# Altium footprint library pmu.PcbLib: 86 footprints (part 6 of 6)
Each footprint in its own frame and in the unit in brackets; x right, y up, seen from the top. Pads: shape width x height; smd on the part's side, far side on the other; paste and mask are expansions set on the pad; w line width, h text height; cw(c..) or ccw(c..) is an arc to the next point about the centre after c.
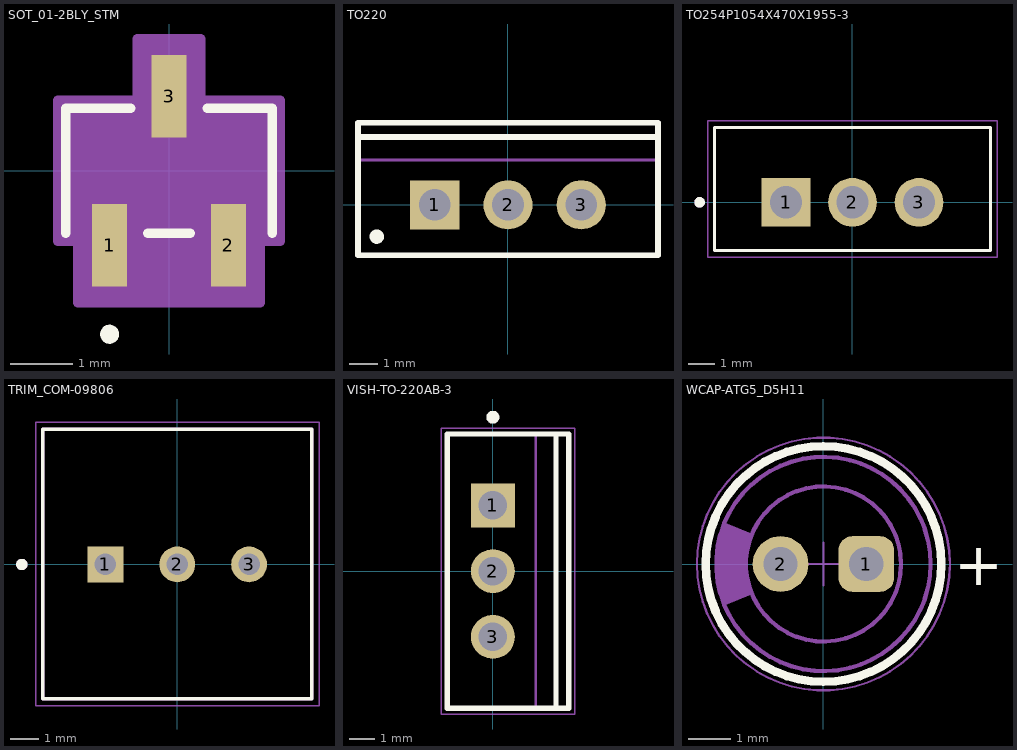
[diagram p5: the footprints below, top view; thin cyan lines are the x and y axes]

## SOT_01-2BLY_STM [mil]
pads (3):
  rect 22x52 smd paste+0 mask+0: 1(-37.4,-47) 2(37.4,-47) 3(0,47)
Top Overlay:
  circle w6: c-37.4,-103 r3
  lines w6: -65,-39.5 -65,39.5 -24.1,39.5 ; -13.3,-39.5 13.3,-39.5 ; 24.1,39.5 65,39.5 65,-39.5
Mechanical 13:
  circle w0: c-37.4,-24.5 r3
  lines w1: -60,-34.5 -60,34.5 60,34.5 60,-34.5 -60,-34.5 ; -47.4,-59 -27.4,-59 -27.4,-34.5 -47.4,-34.5 -47.4,-59 ; -10,34.5 -10,59 10,59 10,34.5 -10,34.5 ; 27.4,-59 47.4,-59 47.4,-34.5 27.4,-34.5 27.4,-59
Mechanical 15:
  region: -70,-44.5 -70,44.5 -20,44.5 -20,83 20,83 20,44.5 70,44.5 70,-44.5 57.4,-44.5 57.4,-83 -57.4,-83 -57.4,-44.5
  lines w6: -70,-44.5 -57.4,-44.5 -57.4,-83 57.4,-83 57.4,-44.5 70,-44.5 70,44.5 20,44.5 20,83 -20,83 -20,44.5 -70,44.5 -70,-44.5
3D body "SOT_01-2BLY_STM.step": height 49.09, standoff 0, extent -60,-59.02 60,59.02

## TO220 [mm] "TO, Thru-Hole, Vertical, Heatsink Mounted; 3 In-Line Leads; Pitch 2.54 mm"
height 19.7
pads (3):
  rect 1.7x1.7 hole 1.1: 1(-2.54,0)
  round 1.7 hole 1.1: 2(0,0) 3(2.54,0)
Top Overlay:
  circle w0.25: c-4.55,-1.1 r0.125
  lines w0.2: -5.2,2.35 5.2,2.35 ; -5.2,-1.75 5.2,-1.75 5.2,2.85 -5.2,2.85 -5.2,-1.75
Mechanical 13:
  lines w0.1: -5.2,1.55 5.2,1.55 ; -5.2,-1.75 -5.2,2.85 5.2,2.85 5.2,-1.75 -5.2,-1.75
Mechanical 15:
  lines w0.1: -0.5,0 0.5,0 ; 0,-0.5 0,0.5
3D body: height 13.05, standoff 3.5, extent -5.25,-1.8 5.25,2.9
3D body: height 19.7, standoff 13.05, extent -5.199,1.551 5.199,2.849

## TO254P1054X470X1955-3 [mm]
pads (3):
  rect 1.86x1.86 hole 1.24: 1(-2.54,0)
  round 1.86 hole 1.24: 2(0,0) 3(2.54,0)
Top Overlay:
  circle w0.2: c-5.84,0 r0.1
  lines w0.127: -5.27,-1.84 5.27,-1.84 5.27,2.86 -5.27,2.86 -5.27,-1.84
Mechanical 13:
  circle w0.2: c-5.84,0 r0.1
  lines w0.127: -5.27,-1.84 5.27,-1.84 5.27,2.86 -5.27,2.86 -5.27,-1.84
Mechanical 15:
  lines w0.05: -5.52,-2.09 5.52,-2.09 5.52,3.11 -5.52,3.11 -5.52,-2.09

## TRIM_COM-09806 [mm]
pads (3):
  rect 1.268x1.268 hole 0.76: 1(-2.54,0)
  round 1.268 hole 0.76: 2(0,0) 3(2.54,0)
Top Overlay:
  circle w0.2: c-5.5,0 r0.1
  lines w0.127: -4.765,-4.75 -4.765,4.78 4.765,4.78 4.765,-4.75 -4.765,-4.75
Mechanical 13:
  circle w0.2: c-5.5,0 r0.1
  lines w0.127: -4.765,-4.75 4.765,-4.75 4.765,4.78 -4.765,4.78 -4.765,-4.75
Mechanical 15:
  lines w0.05: -5.015,-5 -5.015,5.03 5.015,5.03 5.015,-5 -5.015,-5

## VISH-TO-220AB-3 [mm] "FM, 3-Leads, Body 10.55x4.65mm, Pitch 2.54mm"
height 19.31
pads (3):
  rect 1.7x1.7 hole 1.1: 1(0,2.54)
  round 1.7 hole 1.1: 2(0,0) 3(0,-2.54)
Top Overlay:
  circle w0.25: c0,5.95 r0.125
  lines w0.2: 2.435,-5.3 2.435,5.3 ; -1.765,-5.3 -1.765,5.3 2.935,5.3 2.935,-5.3 -1.765,-5.3
Mechanical 13:
  lines w0.1: 1.66,-5.275 1.66,5.275 ; -1.74,-5.275 2.91,-5.275 2.91,5.275 -1.74,5.275 -1.74,-5.275
Mechanical 15:
  lines w0.05: -1.99,-5.525 3.16,-5.525 3.16,5.525 -1.99,5.525 -1.99,-5.525
  lines w0.1: -0.5,0 0.5,0 ; 0,-0.5 0,0.5
3D body: height 19.31, standoff 18.39, extent 1.66,-5.15 2.91,5.15
3D body: height 16.88, standoff 16.51, extent 1.66,-5.15 2.91,-1.875
3D body: height 16.88, standoff 16.51, extent 1.66,1.875 2.91,5.15
3D body: height 16.51, standoff 16.14, extent 1.66,-5.15 2.91,-1.875
3D body: height 16.51, standoff 16.14, extent 1.66,1.875 2.91,5.15
3D body: height 17.23, standoff 16.88, extent 1.66,-5.15 2.91,-1.839
3D body: height 17.23, standoff 16.88, extent 1.66,1.839 2.91,5.15
3D body: height 16.15, standoff 15.79, extent 1.66,-5.15 2.91,-1.839
3D body: height 16.15, standoff 15.79, extent 1.66,1.839 2.91,5.15
3D body: height 17.56, standoff 17.23, extent 1.66,-5.15 2.91,-1.732
3D body: height 17.56, standoff 17.23, extent 1.66,1.732 2.91,5.15
3D body: height 15.8, standoff 15.47, extent 1.66,-5.15 2.91,-1.732
3D body: height 15.8, standoff 15.47, extent 1.66,1.732 2.91,5.15
3D body: height 17.84, standoff 17.55, extent 1.66,-5.15 2.91,-1.559
3D body: height 17.84, standoff 17.55, extent 1.66,1.559 2.91,5.15
3D body: height 15.47, standoff 15.18, extent 1.66,-5.15 2.91,-1.559
3D body: height 15.47, standoff 15.18, extent 1.66,1.559 2.91,5.15
3D body: height 18.07, standoff 17.84, extent 1.66,-5.15 2.91,-1.326
3D body: height 18.07, standoff 17.84, extent 1.66,1.326 2.91,5.15
3D body: height 15.19, standoff 14.95, extent 1.66,-5.15 2.91,-1.326
3D body: height 15.19, standoff 14.95, extent 1.66,1.326 2.91,5.15
3D body: height 18.25, standoff 18.07, extent 1.66,-5.15 2.91,-1.042
3D body: height 18.25, standoff 18.07, extent 1.66,1.042 2.91,5.15
3D body: height 14.96, standoff 14.78, extent 1.66,-5.15 2.91,-1.042
3D body: height 14.96, standoff 14.78, extent 1.66,1.042 2.91,5.15
3D body: height 18.35, standoff 18.24, extent 1.66,-5.15 2.91,-0.718
3D body: height 18.35, standoff 18.24, extent 1.66,0.718 2.91,5.15
3D body: height 14.78, standoff 14.67, extent 1.66,-5.15 2.91,-0.718
3D body: height 14.78, standoff 14.67, extent 1.66,0.718 2.91,5.15
3D body: height 18.39, standoff 18.35, extent 1.66,-5.15 2.91,-0.366
3D body: height 18.39, standoff 18.35, extent 1.66,0.366 2.91,5.15
3D body: height 14.68, standoff 14.64, extent 1.66,-5.15 2.91,-0.366
3D body: height 14.68, standoff 14.64, extent 1.66,0.366 2.91,5.15
3D body: height 14.64, standoff 13.01, extent 1.66,-5.15 2.91,5.15
3D body: height 13.01, standoff 3.32, extent -1.74,-5.275 2.91,5.275
3D body: height 0, standoff -1.6, extent -0.245,-2.965 0.245,-2.115
3D body: height 3.32, standoff 0, extent -0.245,-3.275 0.245,-1.805
3D body: height 0, standoff -1.6, extent -0.245,-0.425 0.245,0.425
3D body: height 3.32, standoff 0, extent -0.245,-0.735 0.245,0.735
3D body: height 0, standoff -1.6, extent -0.245,2.115 0.245,2.965
3D body: height 3.32, standoff 0, extent -0.245,1.805 0.245,3.275

## WCAP-ATG5_D5H11 [mm] "Aluminum Electrolytic Capacitors, 5x11mm"
height 11
pads (2):
  rrect50% 1.3x1.3 hole 0.8: 1(1,0)
  round 1.3 hole 0.8: 2(-1,0)
Top Overlay:
  circle w0.2: c0,0 r2.75
  text "+" at 3.05,-0.5 h1
Top Courtyard:
  circle w0.05: c0,0 r2.95
  lines w0.05: -0.5,0 0.5,0 ; 0,-0.5 0,0.5
Top Designator:
  text ".Designator" at -4.998,-0.333 h1
Top Component Outline:
  circle w0.1: c0,0 r2.5
  circle w0.1: c0,0 r1.81
  region: -2.305,-0.968 -1.668,-0.702 -1.669,-0.701 -1.73,-0.532 -1.801,-0.18 -1.801,0.18 -1.73,0.532 -1.669,0.701 -1.668,0.702 -2.305,0.968 -2.402,0.738 -2.5,0.249 -2.5,-0.249 -2.402,-0.738
3D body "5x11x2x0.5.stp": height 11.31, standoff -19.91, extent -2.49,-2.5 2.5,2.5